# Altium footprint library SparkFun.PCBLIB: 674 footprints (part 34 of 44)
Each footprint in its own frame and in the unit in brackets; x right, y up, seen from the top. Pads: shape width x height; smd on the part's side, far side on the other; paste and mask are expansions set on the pad; w line width, h text height; cw(c..) or ccw(c..) is an arc to the next point about the centre after c.
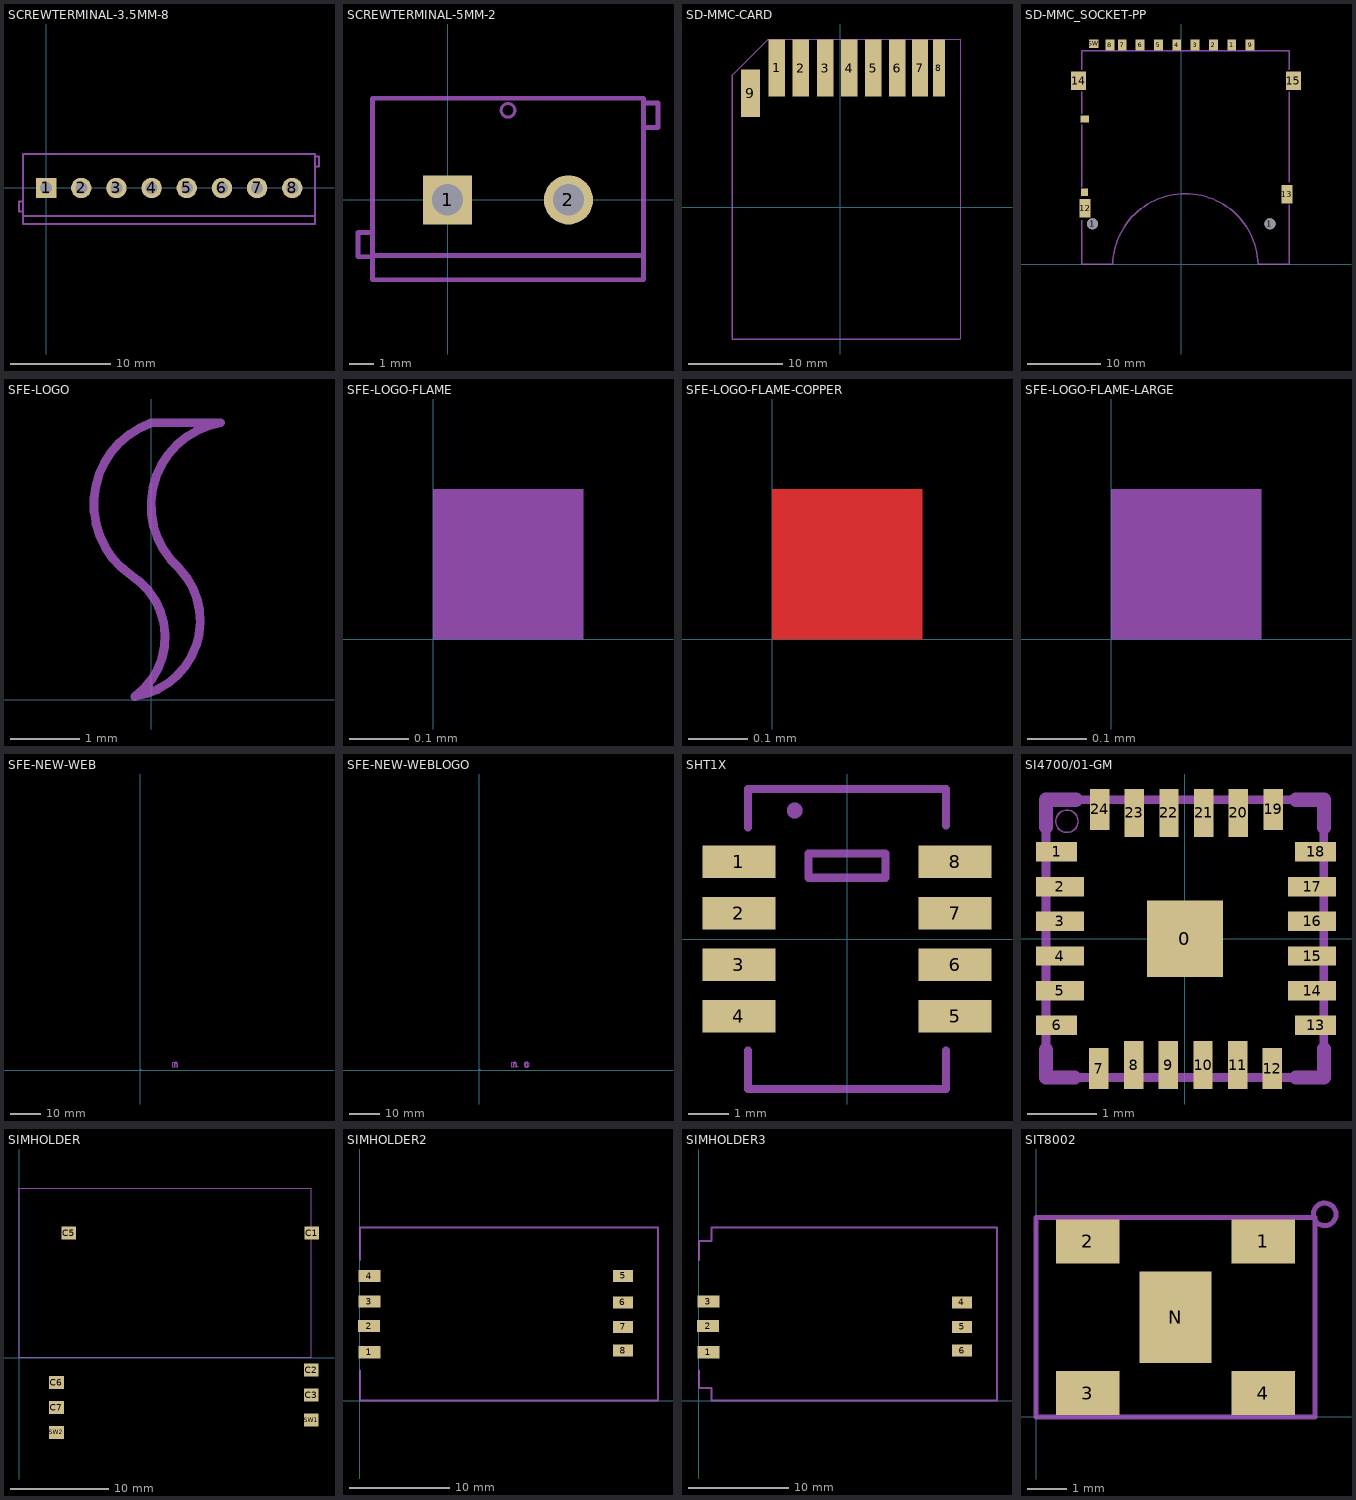
[diagram p33: the footprints below, top view; thin cyan lines are the x and y axes]

## SCREWTERMINAL-3.5MM-8 [mil]
pads (8):
  rect 80x80 hole 47.24: 1(0,0)
  round 80 hole 47.24: 2(137.8,0) 3(275.59,0) 4(413.39,0) 5(551.18,0) 6(688.98,0) 7(826.77,0) 8(964.57,0)
Mechanical 2:
  lines w8: -90.55,-110.24 -90.55,-141.73 1053.54,-141.73 1053.54,-110.24 ; -90.55,-110.24 -90.55,133.86 1053.54,133.86 1053.54,-110.24 ; -90.55,-110.24 1053.54,-110.24
Mechanical 18:
  lines w8: -90.55,-92.52 -106.3,-92.52 -106.3,-53.15 -90.55,-53.15 ; 1053.54,84.65 1069.29,84.65 1069.29,124.02 1053.54,124.02

## SCREWTERMINAL-5MM-2 [mil]
pads (2):
  rect 80x80 hole 51.18: 1(0,0)
  round 80 hole 51.18: 2(196.85,0)
Mechanical 2:
  lines w8: -122.05,-90.55 -122.05,-129.92 318.9,-129.92 318.9,-90.55 ; -122.05,-90.55 -122.05,165.35 318.9,165.35 318.9,-90.55 ; -122.05,-90.55 318.9,-90.55
Mechanical 18:
  circle w5: c98.43,145.67 r11.13
  lines w8: -122.05,-92.52 -145.67,-92.52 -145.67,-53.15 -122.05,-53.15 ; 318.9,118.11 342.52,118.11 342.52,157.48 318.9,157.48

## SD-MMC-CARD [mm]
pads (9):
  rect 1.75x6 smd: 1(-6.745,14.713) 2(-4.195,14.703) 3(-1.6,14.703) 4(0.93,14.703) 5(3.465,14.703) 6(6.03,14.703)
  rect 1.65x6 smd: 7(8.43,14.703)
  rect 1.25x6 smd: 8(10.43,14.703)
  rect 2x5 smd: 9(-9.53,12.03)
Mechanical 2:
  lines w0.127: -11.43,14.03 -11.43,-13.97 12.57,-13.97
Mechanical 18:
  lines w0.127: -11.43,-13.97 -11.43,13.97 -7.62,17.78 12.7,17.78 12.7,-13.97 -11.43,-13.97

## SD-MMC_SOCKET-PP [mm]
pads (18):
  round 1.5 hole 1.5: 1(-12.1,5.5) 1(12.1,5.5)
  rect 1.2x1.5 smd: 1(6.88,29.85) 2(4.38,29.85) 3(1.88,29.85) 4(-0.62,29.85) 5(-3.12,29.85) 6(-5.62,29.85) 7(-8.04,29.85) 8(-9.728,29.87) 9(9.38,29.85)
  rect 1.5x2.5 smd: 12(-13.1,7.6) 13(14.402,9.525)
  rect 2x2.5 smd: 14(-14,25) 15(15.3,25)
  rect 1.15x1 smd: CD(-13.18,19.8)
  rect 1.3x1.1 smd: SW(-11.938,30.048)
  rect 1x1.05 smd: WP(-13.18,9.8)
Mechanical 2:
  lines w0.203: -13.6,6 -13.6,0 -9.34,0 cw(c0.57,-0.297) 10.48,0 14.75,0 14.75,8.128 ; -13.6,10.5 -13.6,19 ; -13.6,20.5 -13.6,23.5 ; -13.6,26.5 -13.6,29.1 14.75,29.1 14.75,26.5 ; 14.75,11.176 14.75,23.5

## SFE-LOGO [mil]
Mechanical 2:
  rectangle: -0.79,6.69 0.79,10.24
  lines w5: -11.81,70.87 cw(c16.42,111.13) 0,157.48 39.37,157.48 ccw(c47.49,110.45) 15.75,74.8 cw(c-15.62,44.88) -9.45,1.97 ccw(c-33.76,35.63) -11.81,70.87

## SFE-LOGO-FLAME [mil]
Mechanical 2:
  region: 0,0 10,0 10,10 0,10

## SFE-LOGO-FLAME-COPPER [mil]
Top Layer:
  region: 0,0 10,0 10,10 0,10

## SFE-LOGO-FLAME-LARGE [mil]
Mechanical 2:
  region: 0,0 10,0 10,10 0,10

## SFE-NEW-WEB [mil]
Mechanical 2:
  region: 0,0 10,0 10,10 0,10
  region: 0,0 10,0 10,10 0,10
  region: 0,0 10,0 10,10 0,10
  region: 0,0 10,0 10,10 0,10
  region: 0,0 10,0 10,10 0,10
  region: 0,0 10,0 10,10 0,10
  region: 0,0 10,0 10,10 0,10
  region: 0,0 10,0 10,10 0,10
  region: 0,0 10,0 10,10 0,10
  lines w1: 421.9,37.2 421.9,99.1 437.8,99.1 437.8,90.4 438.1,90.4 ccw(c438.1,91.37) 438.8,90.7 ccw(c434.55,94.75) 439.3,91.3 cw(c610.67,-33.22) 440.4,92.8 cw(c455.22,81.8) 443.8,96.3 cw(c456.25,80.52) 455.4,100.6 cw(c457.86,41.57) 463.3,100.4 cw(c461.73,83.33) 473.8,95.5 cw(c461.46,83.06) 478.3,87.9 cw(c446.15,78.65) 479.6,79.1 479.6,37.6 463.5,37.6 463.5,75.6 ccw(c447.37,75.6) 461.2,83.9 ccw(c453.54,79.31) 456.6,87.7 ccw(c454.3,81.41) 454,88.1 cw(c371.04,1864.8) 449.6,87.9 ccw(c450.05,77.58) 443.3,85.4 ccw(c451.72,75.64) 439.7,80.3 ccw(c456.29,73.87) 438.5,74.1 ccw(c543.84,72.75) 438.5,71.4 438.5,37.2 421.9,37.2

## SFE-NEW-WEBLOGO [mil]
Mechanical 2:
  rectangle: 489.2,37.2 508.7,56.3
  region: 0,0 10,0 10,10 0,10
  region: 0,0 10,0 10,10 0,10
  region: 0,0 10,0 10,10 0,10
  region: 0,0 10,0 10,10 0,10
  region: 0,0 10,0 10,10 0,10
  region: 0,0 10,0 10,10 0,10
  region: 0,0 10,0 10,10 0,10
  region: 0,0 10,0 10,10 0,10
  region: 0,0 10,0 10,10 0,10
  region: 0,0 10,0 10,10 0,10
  region: 0,0 10,0 10,10 0,10
  region: 0,0 10,0 10,10 0,10
  region: 0,0 10,0 10,10 0,10
  lines w1: 421.9,37.2 421.9,99.1 437.8,99.1 437.8,90.4 438.1,90.4 ccw(c438.1,91.37) 438.8,90.7 ccw(c434.55,94.75) 439.3,91.3 cw(c610.67,-33.22) 440.4,92.8 cw(c455.22,81.8) 443.8,96.3 cw(c456.25,80.52) 455.4,100.6 cw(c457.86,41.57) 463.3,100.4 cw(c461.73,83.33) 473.8,95.5 cw(c461.46,83.06) 478.3,87.9 cw(c446.15,78.65) 479.6,79.1 479.6,37.6 463.5,37.6 463.5,75.6 ccw(c447.37,75.6) 461.2,83.9 ccw(c453.54,79.31) 456.6,87.7 ccw(c454.3,81.41) 454,88.1 cw(c371.04,1864.8) 449.6,87.9 ccw(c450.05,77.58) 443.3,85.4 ccw(c451.72,75.64) 439.7,80.3 ccw(c456.29,73.87) 438.5,74.1 ccw(c543.84,72.75) 438.5,71.4 438.5,37.2 421.9,37.2 ; 580.8,61.7 ccw(c613.49,67.07) 585.1,50 ccw(c604.68,61.77) 590.2,44.1 ccw(c612.31,71.07) 611.9,36.2 ccw(c612.42,79.8) 626.1,38.4 ccw(c617.79,63.52) 642.4,53.8 ccw(c597.23,71.66) 645.8,71.2 ccw(c614.38,71.49) 635,95.2 ccw(c614.82,71.99) 622.4,101.8 ccw(c613.61,67.21) 613.6,102.9 613,102.9 613,90.4 cw(c613.1,71.3) 619.2,89.4 cw(c615.95,79.74) 623.3,86.8 cw(c608.97,73.05) 628.3,77.6 cw(c587.89,68.1) 629.4,67.7 cw(c602.89,67.94) 626.3,55.5 cw(c615.4,61.29) 620.6,50.1 cw(c612.98,66.47) 607.4,49.3 cw(c611.38,61.57) 600,55.5 cw(c621.05,66.72) 597.3,64.5 cw(c655.46,69.95) 597.2,74.2 cw(c617.88,72.69) 601.5,85.4 cw(c611.3,77.79) 611.3,90.2 612.2,90.2 612.2,102.9 ccw(c613.58,67.65) 595.6,98 ccw(c611.38,71.36) 580.9,76.8 ccw(c624.9,68.96) 580.8,61.7

## SHT1X [mil]
pads (8):
  rect 70.87x31.5 smd: 1(-105,75) 2(-105,25) 3(-105,-25) 4(-105,-75) 5(105,-75) 6(105,-25) 7(105,25) 8(105,75)
Mechanical 2:
  circle w8: c-50.79,124.8 r3.71
  lines w8: -96.06,-108.27 -96.06,-145.67 96.06,-145.67 96.06,-108.27 ; -96.06,108.27 -96.06,145.67 96.06,145.67 96.06,110.24 ; -37.4,59.45 37.4,59.45 37.4,83.07 -37.4,83.07 -37.4,59.45

## SI4700/01-GM [mm]
pads (25):
  rect 1.1x1.1 smd paste-0.55: 0(0,0)
  rect 0.59x0.28 smd: 1(-1.85,1.25) 6(-1.85,-1.25) 13(1.88,-1.25) 18(1.88,1.25)
  rect 0.69x0.28 smd: 2(-1.8,0.75) 3(-1.8,0.25) 4(-1.8,-0.25) 5(-1.8,-0.75) 14(1.83,-0.75) 15(1.83,-0.25) 16(1.83,0.25) 17(1.83,0.75)
  rect 0.28x0.59 smd: 7(-1.24,-1.87) 12(1.26,-1.87) 19(1.27,1.86) 24(-1.23,1.86)
  rect 0.28x0.69 smd: 8(-0.74,-1.82) 9(-0.24,-1.82) 10(0.26,-1.82) 11(0.76,-1.82) 20(0.77,1.81) 21(0.27,1.81) 22(-0.23,1.81) 23(-0.73,1.81)
Top Paste:
  rectangle: -0.254,-0.254 0.254,0.254
Mechanical 2:
  circle w0.02: c-1.7,1.69 r0.161
  lines w0.203: -2,-1.6 -2,-2 -1.59,-2 ; -2,1.61 -2,2 -1.57,2 ; 1.6,-2 2,-2 2,-1.59 ; 1.6,2 2,2 2,1.6
Mechanical 18:
  lines w0.127: -2,-2 -2,2 2,2 2,-2 -2,-2

## SIMHOLDER [mil]
pads (8):
  rect 59.06x51.18 smd: C1(1173.62,500) C2(1172.44,-49.61) C3(1172.44,-150) C5(200,500) C6(150,-100) C7(150,-200) SW1(1172.44,-250) SW2(150,-300)
Mechanical 2:
  lines w5: 0,0 0,680 1170,680 1170,0 0,0

## SIMHOLDER2 [mm]
pads (8):
  rect 2.2x1.2 smd: 1(0.95,4.81) 2(0.91,7.41) 3(0.95,9.86) 4(0.95,12.39)
  rect 2x1.2 smd: 5(26.22,12.42) 6(26.2,9.78) 7(26.22,7.34) 8(26.22,4.98)
Mechanical 2:
  lines w0.203: 0,3 0,0 29.7,0 29.7,17.245 0,17.245 ; 0,14 0,17.24

## SIMHOLDER3 [mm]
pads (6):
  rect 2.2x1.2 smd: 1(0.95,4.81) 2(0.91,7.41) 3(0.95,9.86)
  rect 2x1.2 smd: 4(26.2,9.78) 5(26.22,7.34) 6(26.22,4.98)
Mechanical 2:
  lines w0.203: 0,3 0,1.27 1.27,1.27 1.27,0 29.7,0 29.7,17.245 1.27,17.245 ; 0,14 0,15.875 1.27,15.875 1.27,17.145

## SIT8002 [mm]
pads (5):
  rect 1.6x1.1 smd: 1(5.7,4.4) 2(1.3,4.4) 3(1.3,0.6) 4(5.7,0.6)
  rect 1.8x2.3 smd: N(3.5,2.5)
Mechanical 2:
  circle w0.127: c7.239,5.08 r0.284
Mechanical 18:
  lines w0.127: 0,0 7,0 7,5 0,5 0,0